# Altium schematic symbol library Analog Devices Data Converters Analog-to-Digital Converters.SchLib: 2404 symbols (part 14 of 213)
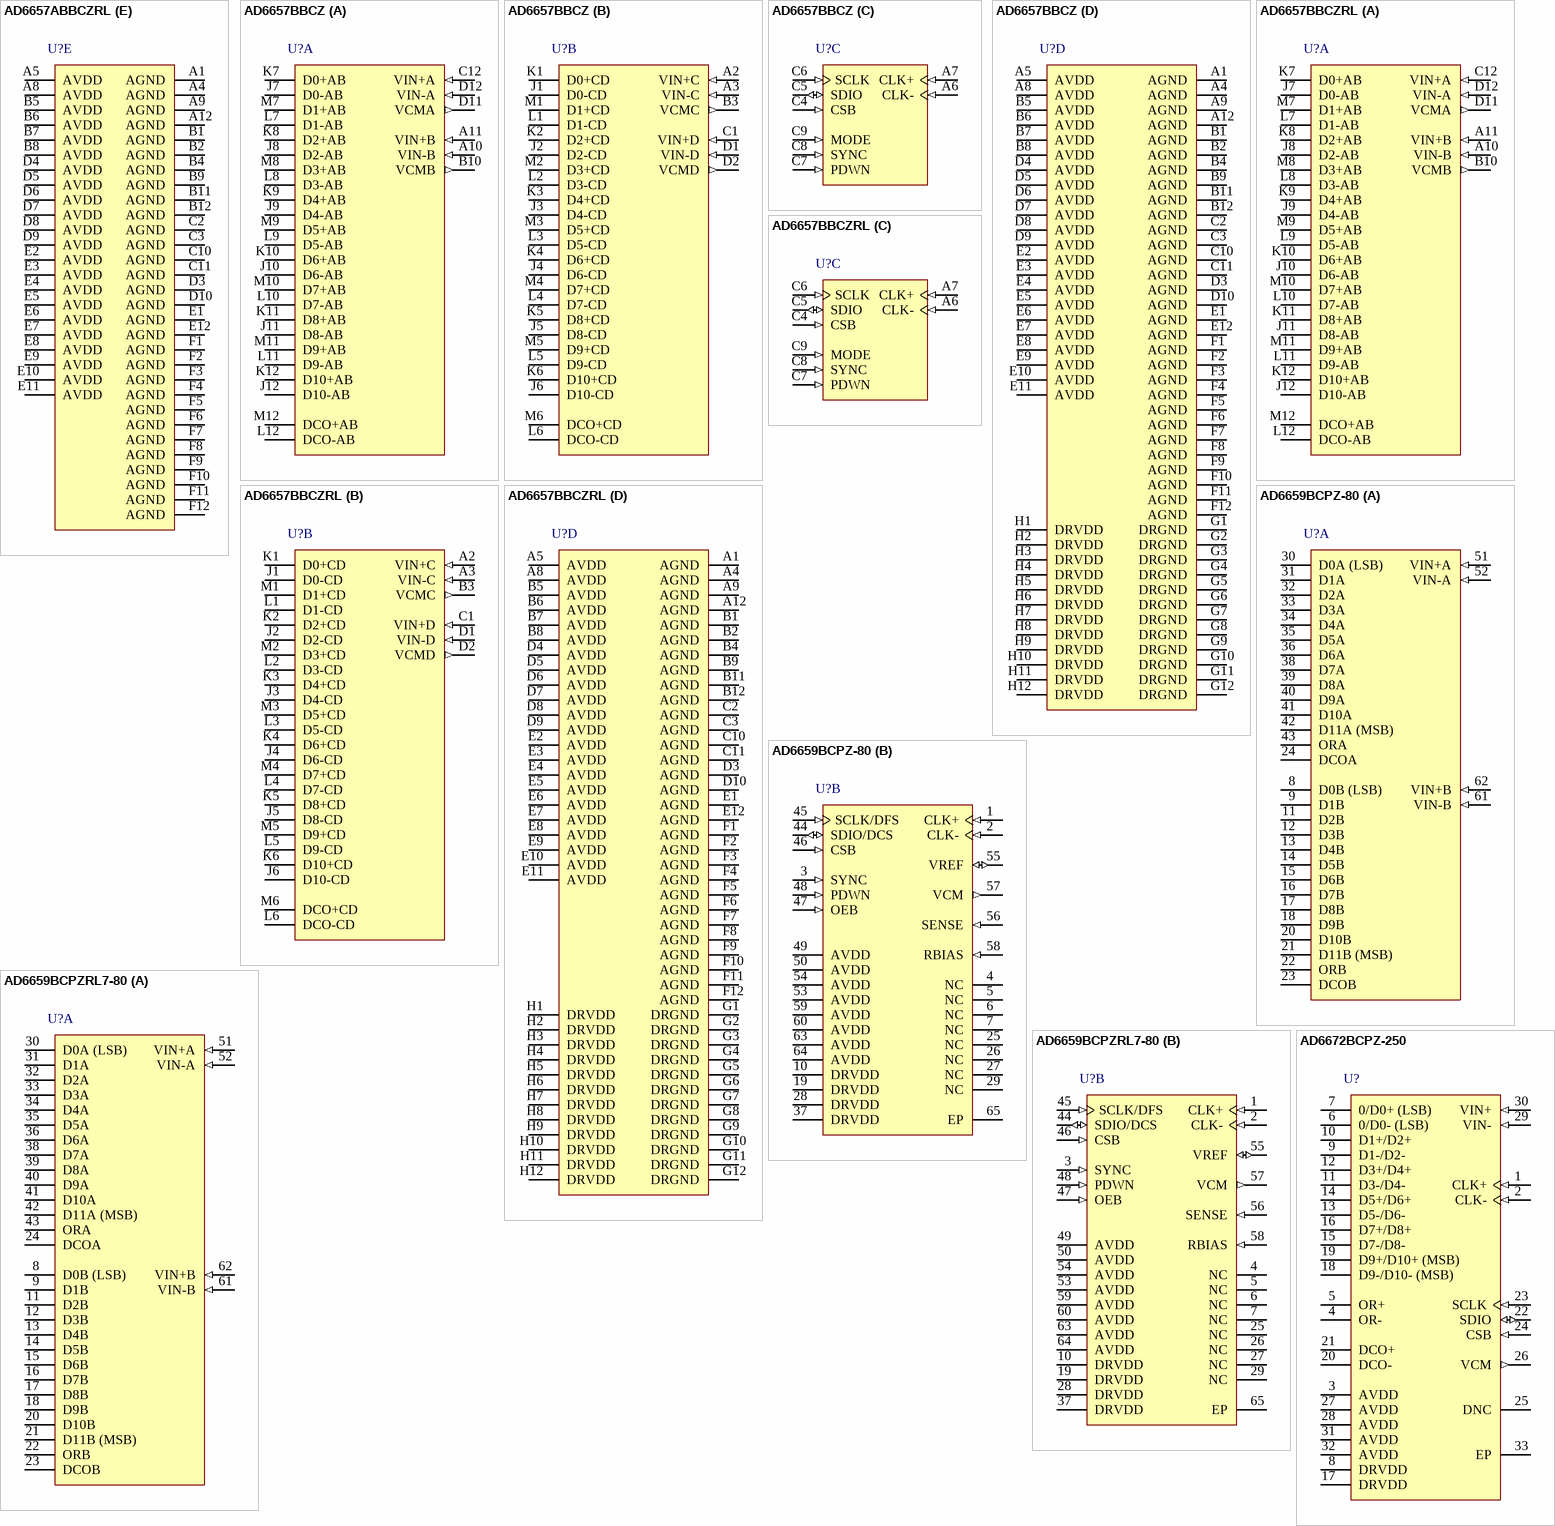
[diagram p169: symbols AD6657ABBCZRL to AD6672BCPZ-250]

## AD6657ABBCZRL
designator U?
Quad IF Receiver, -40 to +85 degC, BC-144-1, Pb-Free, Reel; Generic Part Number: AD6657A; Manufacturer: Analog Devices; PartNumber: AD6657ABBCZRL; Channels: 4; DatasheetVersion: Rev.0; PackageVersion: 012006-0; PackageReference: BC-144-1; PackageDescription: 144-Ball Chip Scale Package Ball Grid Array [CSP_BGA]; Supplier 1: Digi-Key; Supplier Part Number 1: AD6657ABBCZRL-ND; Supplier 2: Mouser; Supplier Part Number 2: 584-AD6657ABBCZR; RoHS: Y; Packing: Reel; Mounting Technology: Surface Mount; Code_JEDEC: MO-205-AC; ComponentLink1Description: Manufacturer URL; ComponentLink1URL: http://www.analog.com/en/index.html; ComponentLink2Description: Datasheet; ComponentLink2URL: http://www.analog.com/static/imported-files/data_sheets/AD6657A.pdf; ComponentLink3Description: Package Specification; ComponentLink3URL: http://www.analog.com/static/imported-files/packages/453163286836504146030385BC_144_1.pdf; ComponentLink4Description: Product URL; ComponentLink4URL: http://www.analog.com/en/analog-to-digital-converters/integrated-receivers/ad6657a/products/product.html
footprint BC-144-1 (BGA, 144-Leads, Body 10x10mm, Pitch 0.8mm)
part A pins: A10 VIN-B (in) "Differential Analog Input Pin (-) for Channel B.", A11 VIN+B (in) "Differential Analog Input Pin (+) for Channel B.", B10 VCMB (out) "Common-Mode Level Bias Output for Analog Input Channel B.", C12 VIN+A (in) "Differential Analog Input Pin (+) for Channel A.", D11 VCMA (out) "Common-Mode Level Bias Output for Analog Input Channel A.", D12 VIN-A (in) "Differential Analog Input Pin (-) for Channel A.", J7 D0-AB (out) "Channel A and Channel B LVDS Output Data 0--Complement.", J8 D2-AB (out) "Channel A and Channel B LVDS Output Data 2--Complement.", J9 D4-AB (out) "Channel A and Channel B LVDS Output Data 4--Complement.", J10 D6-AB (out) "Channel A and Channel B LVDS Output Data 6--Complement.", J11 D8-AB (out) "Channel A and Channel B LVDS Output Data 8--Complement.", J12 D10-AB (out) "Channel A and Channel B LVDS Output Data 10--Complement.", K7 D0+AB (out) "Channel A and Channel B LVDS Output Data 0--True.", K8 D2+AB (out) "Channel A and Channel B LVDS Output Data 2--True.", K9 D4+AB (out) "Channel A and Channel B LVDS Output Data 4--True.", K10 D6+AB (out) "Channel A and Channel B LVDS Output Data 6--True.", K11 D8+AB (out) "Channel A and Channel B LVDS Output Data 8--True.", K12 D10+AB (out) "Channel A and Channel B LVDS Output Data 10--True.", L7 D1-AB (out) "Channel A and Channel B LVDS Output Data 1--Complement.", L8 D3-AB (out) "Channel A and Channel B LVDS Output Data 3--Complement.", L9 D5-AB (out) "Channel A and Channel B LVDS Output Data 5--Complement.", L10 D7-AB (out) "Channel A and Channel B LVDS Output Data 7--Complement.", L11 D9-AB (out) "Channel A and Channel B LVDS Output Data 9--Complement.", L12 DCO-AB (out) "Data Clock LVDS Output for Channel A and Channel B--Complement.", M7 D1+AB (out) "Channel A and Channel B LVDS Output Data 1--True.", M8 D3+AB (out) "Channel A and Channel B LVDS Output Data 3--True.", M9 D5+AB (out) "Channel A and Channel B LVDS Output Data 5--True.", M10 D7+AB (out) "Channel A and Channel B LVDS Output Data 7--True.", M11 D9+AB (out) "Channel A and Channel B LVDS Output Data 9--True.", M12 DCO+AB (out) "Data Clock LVDS Output for Channel A and Channel B--True."
part B pins: A2 VIN+C (in) "Differential Analog Input Pin (+) for Channel C.", A3 VIN-C (in) "Differential Analog Input Pin (-) for Channel C.", B3 VCMC (out) "Common-Mode Level Bias Output for Analog Input Channel C.", C1 VIN+D (in) "Differential Analog Input Pin (+) for Channel D.", D1 VIN-D (in) "Differential Analog Input Pin (-) for Channel D.", D2 VCMD (out) "Common-Mode Level Bias Output for Analog Input Channel D.", J1 D0-CD (out) "Channel C and Channel D LVDS Output Data 0--Complement.", J2 D2-CD (out) "Channel C and Channel D LVDS Output Data 2--Complement.", J3 D4-CD (out) "Channel C and Channel D LVDS Output Data 4--Complement.", J4 D6-CD (out) "Channel C and Channel D LVDS Output Data 6--Complement.", J5 D8-CD (out) "Channel C and Channel D LVDS Output Data 8--Complement.", J6 D10-CD (out) "Channel C and Channel D LVDS Output Data 10--Complement.", K1 D0+CD (out) "Channel C and Channel D LVDS Output Data 0--True.", K2 D2+CD (out) "Channel C and Channel D LVDS Output Data 2--True.", K3 D4+CD (out) "Channel C and Channel D LVDS Output Data 4--True.", K4 D6+CD (out) "Channel C and Channel D LVDS Output Data 6--True.", K5 D8+CD (out) "Channel C and Channel D LVDS Output Data 8--True.", K6 D10+CD (out) "Channel C and Channel D LVDS Output Data 10--True.", L1 D1-CD (out) "Channel C and Channel D LVDS Output Data 1--Complement.", L2 D3-CD (out) "Channel C and Channel D LVDS Output Data 3--Complement.", L3 D5-CD (out) "Channel C and Channel D LVDS Output Data 5--Complement.", L4 D7-CD (out) "Channel C and Channel D LVDS Output Data 7--Complement.", L5 D9-CD (out) "Channel C and Channel D LVDS Output Data 9--Complement.", L6 DCO-CD (out) "Data Clock LVDS Output for Channel C and Channel D--Complement.", M1 D1+CD (out) "Channel C and Channel D LVDS Output Data 1--True.", M2 D3+CD (out) "Channel C and Channel D LVDS Output Data 3--True.", M3 D5+CD (out) "Channel C and Channel D LVDS Output Data 5--True.", M4 D7+CD (out) "Channel C and Channel D LVDS Output Data 7--True.", M5 D9+CD (out) "Channel C and Channel D LVDS Output Data 9--True.", M6 DCO+CD (out) "Data Clock LVDS Output for Channel C and Channel D--True."
part C pins: A6 CLK- (in) "ADC Clock Input--Complement.", A7 CLK+ (in) "ADC Clock Input--True.", C4 CSB (in) "SPI Chip Select (Active Low).", C5 SDIO (io) "SPI Data.", C6 SCLK (in) "SPI Clock.", C7 PDWN (in) "Power-Down Input (Active High).", C8 SYNC (in) "Digital Synchronization Pin.", C9 MODE (in) "Mode Select Pin. Logic low enables NSR; logic high disables NSR."
part D pins: G1 DRGND (power) "Digital Output Driver Ground.", G2 DRGND (power) "Digital Output Driver Ground.", G3 DRGND (power) "Digital Output Driver Ground.", G4 DRGND (power) "Digital Output Driver Ground.", G5 DRGND (power) "Digital Output Driver Ground.", G6 DRGND (power) "Digital Output Driver Ground.", G7 DRGND (power) "Digital Output Driver Ground.", G8 DRGND (power) "Digital Output Driver Ground.", G9 DRGND (power) "Digital Output Driver Ground.", G10 DRGND (power) "Digital Output Driver Ground.", G11 DRGND (power) "Digital Output Driver Ground.", G12 DRGND (power) "Digital Output Driver Ground.", H1 DRVDD (power) "Digital Output Driver Supply. 1.8 V nominal.", H2 DRVDD (power) "Digital Output Driver Supply. 1.8 V nominal.", H3 DRVDD (power) "Digital Output Driver Supply. 1.8 V nominal.", H4 DRVDD (power) "Digital Output Driver Supply. 1.8 V nominal.", H5 DRVDD (power) "Digital Output Driver Supply. 1.8 V nominal.", H6 DRVDD (power) "Digital Output Driver Supply. 1.8 V nominal.", H7 DRVDD (power) "Digital Output Driver Supply. 1.8 V nominal.", H8 DRVDD (power) "Digital Output Driver Supply. 1.8 V nominal.", H9 DRVDD (power) "Digital Output Driver Supply. 1.8 V nominal.", H10 DRVDD (power) "Digital Output Driver Supply. 1.8 V nominal.", H11 DRVDD (power) "Digital Output Driver Supply. 1.8 V nominal.", H12 DRVDD (power) "Digital Output Driver Supply. 1.8 V nominal."
part E pins: A1 AGND (power) "Analog Ground.", A4 AGND (power) "Analog Ground.", A5 AVDD (power) "Analog Power Supply. 1.8 V nominal.", A8 AVDD (power) "Analog Power Supply. 1.8 V nominal.", A9 AGND (power) "Analog Ground.", A12 AGND (power) "Analog Ground.", B1 AGND (power) "Analog Ground.", B2 AGND (power) "Analog Ground.", B4 AGND (power) "Analog Ground.", B5 AVDD (power) "Analog Power Supply. 1.8 V nominal.", B6 AVDD (power) "Analog Power Supply. 1.8 V nominal.", B7 AVDD (power) "Analog Power Supply. 1.8 V nominal.", B8 AVDD (power) "Analog Power Supply. 1.8 V nominal.", B9 AGND (power) "Analog Ground.", B11 AGND (power) "Analog Ground.", B12 AGND (power) "Analog Ground.", C2 AGND (power) "Analog Ground.", C3 AGND (power) "Analog Ground.", C10 AGND (power) "Analog Ground.", C11 AGND (power) "Analog Ground.", D3 AGND (power) "Analog Ground.", D4 AVDD (power) "Analog Power Supply. 1.8 V nominal.", D5 AVDD (power) "Analog Power Supply. 1.8 V nominal.", D6 AVDD (power) "Analog Power Supply. 1.8 V nominal.", D7 AVDD (power) "Analog Power Supply. 1.8 V nominal.", D8 AVDD (power) "Analog Power Supply. 1.8 V nominal.", D9 AVDD (power) "Analog Power Supply. 1.8 V nominal.", D10 AGND (power) "Analog Ground.", E1 AGND (power) "Analog Ground.", E2 AVDD (power) "Analog Power Supply. 1.8 V nominal.", E3 AVDD (power) "Analog Power Supply. 1.8 V nominal.", E4 AVDD (power) "Analog Power Supply. 1.8 V nominal.", E5 AVDD (power) "Analog Power Supply. 1.8 V nominal.", E6 AVDD (power) "Analog Power Supply. 1.8 V nominal.", E7 AVDD (power) "Analog Power Supply. 1.8 V nominal.", E8 AVDD (power) "Analog Power Supply. 1.8 V nominal.", E9 AVDD (power) "Analog Power Supply. 1.8 V nominal.", E10 AVDD (power) "Analog Power Supply. 1.8 V nominal.", E11 AVDD (power) "Analog Power Supply. 1.8 V nominal.", E12 AGND (power) "Analog Ground.", F1 AGND (power) "Analog Ground.", F2 AGND (power) "Analog Ground.", F3 AGND (power) "Analog Ground.", F4 AGND (power) "Analog Ground.", F5 AGND (power) "Analog Ground.", F6 AGND (power) "Analog Ground.", F7 AGND (power) "Analog Ground.", F8 AGND (power) "Analog Ground.", F9 AGND (power) "Analog Ground.", F10 AGND (power) "Analog Ground.", F11 AGND (power) "Analog Ground.", F12 AGND (power) "Analog Ground."

## AD6657BBCZ
designator U?
Quad 11-Bit IF Receiver with LVDS, Parallel Interface, 200MSPS, -40 to +85 degC, BC-144-1, Pb-Free, Tray; Generic Part Number: AD6657; Manufacturer: Analog Devices; PartNumber: AD6657BBCZ; Resolution (Bits): 11; Channels: 4; Throughput Rate (SPS): 200M; DatasheetVersion: Rev.B; PackageVersion: 012006-0; PackageReference: BC-144-1; PackageDescription: 144-Ball Chip Scale Package Ball Grid Array [CSP_BGA]; Supplier 1: Digi-Key; Supplier Part Number 1: AD6657BBCZ-ND; Supplier 2: Farnell; Supplier Part Number 2: 2081220; Supplier 3: Mouser; Supplier Part Number 3: 584-AD6657BBCZ; Interface: LVDS, Par; RoHS: Y; Packing: Tray; Mounting Technology: Surface Mount; Code_JEDEC: MO-205-AC; ComponentLink1Description: Manufacturer URL; ComponentLink1URL: http://www.analog.com/en/index.html; ComponentLink2Description: Datasheet; ComponentLink2URL: http://www.analog.com/static/imported-files/data_sheets/AD6657.pdf; ComponentLink3Description: Package Specification; ComponentLink3URL: http://www.analog.com/static/imported-files/packages/453163286836504146030385BC_144_1.pdf; ComponentLink4Description: Product URL; ComponentLink4URL: http://www.analog.com/en/analog-to-digital-converters/integrated-receivers/ad6657/products/product.html
footprint BC-144-1 (BGA, 144-Leads, Body 10x10mm, Pitch 0.8mm)
part A pins: A10 VIN-B (in) "Differential Analog Input Pin (-) for Channel B", A11 VIN+B (in) "Differential Analog Input Pin (+) for Channel B", B10 VCMB (out) "Common-Mode Level Bias Output for Analog Input Channel B", C12 VIN+A (in) "Differential Analog Input Pin (+) for Channel A", D11 VCMA (out) "Common-Mode Level Bias Output for Analog Input Channel A", D12 VIN-A (in) "Differential Analog Input Pin (-) for Channel A", J7 D0-AB (hiz) "Channel A and Channel B LVDS Output Data 0--Complement", J8 D2-AB (hiz) "Channel A and Channel B LVDS Output Data 2--Complement", J9 D4-AB (hiz) "Channel A and Channel B LVDS Output Data 4--Complement", J10 D6-AB (hiz) "Channel A and Channel B LVDS Output Data 6--Complement", J11 D8-AB (hiz) "Channel A and Channel B LVDS Output Data 8--Complement", J12 D10-AB (hiz) "Channel A and Channel B LVDS Output Data 10--Complement", K7 D0+AB (hiz) "Channel A and Channel B LVDS Output Data 0--True", K8 D2+AB (hiz) "Channel A and Channel B LVDS Output Data 2--True", K9 D4+AB (hiz) "Channel A and Channel B LVDS Output Data 4--True", K10 D6+AB (hiz) "Channel A and Channel B LVDS Output Data 6--True", K11 D8+AB (hiz) "Channel A and Channel B LVDS Output Data 6--True", K12 D10+AB (hiz) "Channel A and Channel B LVDS Output Data 6--True", L7 D1-AB (hiz) "Channel A and Channel B LVDS Output Data 1--Complement", L8 D3-AB (hiz) "Channel A and Channel B LVDS Output Data 3--Complement", L9 D5-AB (hiz) "Channel A and Channel B LVDS Output Data 5--Complement", L10 D7-AB (hiz) "Channel A and Channel B LVDS Output Data 7--Complement", L11 D9-AB (hiz) "Channel A and Channel B LVDS Output Data 9--Complement", L12 DCO-AB (hiz) "Data Clock LVDS Output for Channel A and Channel B--Complement", M7 D1+AB (hiz) "Channel A and Channel B LVDS Output Data 1--True", M8 D3+AB (hiz) "Channel A and Channel B LVDS Output Data 3--True", M9 D5+AB (hiz) "Channel A and Channel B LVDS Output Data 5--True", M10 D7+AB (hiz) "Channel A and Channel B LVDS Output Data 7--True", M11 D9+AB (hiz) "Channel A and Channel B LVDS Output Data 9--True", M12 DCO+AB (hiz) "Data Clock LVDS Output for Channel A and Channel B--True"
part B pins: A2 VIN+C (in) "Differential Analog Input Pin (+) for Channel C", A3 VIN-C (in) "Differential Analog Input Pin (-) for Channel C", B3 VCMC (out) "Common-Mode Level Bias Output for Analog Input Channel C", C1 VIN+D (in) "Differential Analog Input Pin (+) for Channel D", D1 VIN-D (in) "Differential Analog Input Pin (-) for Channel D", D2 VCMD (out) "Common-Mode Level Bias Output for Analog Input Channel D", J1 D0-CD (hiz) "Channel C and Channel D LVDS Output Data 0--Complement", J2 D2-CD (hiz) "Channel C and Channel D LVDS Output Data 2--Complement", J3 D4-CD (hiz) "Channel C and Channel D LVDS Output Data 4--Complement", J4 D6-CD (hiz) "Channel C and Channel D LVDS Output Data 6--Complement", J5 D8-CD (hiz) "Channel C and Channel D LVDS Output Data 8--Complement", J6 D10-CD (hiz) "Channel C and Channel D LVDS Output Data 10--Complement", K1 D0+CD (hiz) "Channel C and Channel D LVDS Output Data 0--True", K2 D2+CD (hiz) "Channel C and Channel D LVDS Output Data 2--True", K3 D4+CD (hiz) "Channel C and Channel D LVDS Output Data 4--True", K4 D6+CD (hiz) "Channel C and Channel D LVDS Output Data 6--True", K5 D8+CD (hiz) "Channel C and Channel D LVDS Output Data 8--True", K6 D10+CD (hiz) "Channel C and Channel D LVDS Output Data 10--True", L1 D1-CD (hiz) "Channel C and Channel D LVDS Output Data 1--Complement", L2 D3-CD (hiz) "Channel C and Channel D LVDS Output Data 3--Complement", L3 D5-CD (hiz) "Channel C and Channel D LVDS Output Data 5--Complement", L4 D7-CD (hiz) "Channel C and Channel D LVDS Output Data 7--Complement", L5 D9-CD (hiz) "Channel C and Channel D LVDS Output Data 9--Complement", L6 DCO-CD (hiz) "Data Clock LVDS Output for Channel C and Channel D--Complement", M1 D1+CD (hiz) "Channel C and Channel D LVDS Output Data 1--True", M2 D3+CD (hiz) "Channel C and Channel D LVDS Output Data 3--True", M3 D5+CD (hiz) "Channel C and Channel D LVDS Output Data 5--True", M4 D7+CD (hiz) "Channel C and Channel D LVDS Output Data 7--True", M5 D9+CD (hiz) "Channel C and Channel D LVDS Output Data 9--True", M6 DCO+CD (hiz) "Data Clock LVDS Output for Channel C and Channel D--True"
part C pins: A6 CLK- (in) "ADC Clock Input--Complement", A7 CLK+ (in) "ADC Clock Input--True", C4 CSB (in) "SPI Chip Select (Active Low)", C5 SDIO (io) "SPI Data", C6 SCLK (in) "SPI Clock", C7 PDWN (in) "Power-Down Input (Active High)", C8 SYNC (in) "Digital Synchronization Pin", C9 MODE (in) "Mode Select Pin (Logic Low Enables NSR; Logic High Disables NSR)"
part D pins: A1 AGND (power) "Analog Ground", A4 AGND (power) "Analog Ground", A5 AVDD (power) "Analog Power Supply (1.8 V Nominal)", A8 AVDD (power) "Analog Power Supply (1.8 V Nominal)", A9 AGND (power) "Analog Ground", A12 AGND (power) "Analog Ground", B1 AGND (power) "Analog Ground", B2 AGND (power) "Analog Ground", B4 AGND (power) "Analog Ground", B5 AVDD (power) "Analog Power Supply (1.8 V Nominal)", B6 AVDD (power) "Analog Power Supply (1.8 V Nominal)", B7 AVDD (power) "Analog Power Supply (1.8 V Nominal)", B8 AVDD (power) "Analog Power Supply (1.8 V Nominal)", B9 AGND (power) "Analog Ground", B11 AGND (power) "Analog Ground", B12 AGND (power) "Analog Ground", C2 AGND (power) "Analog Ground", C3 AGND (power) "Analog Ground", C10 AGND (power) "Analog Ground", C11 AGND (power) "Analog Ground", D3 AGND (power) "Analog Ground", D4 AVDD (power) "Analog Power Supply (1.8 V Nominal)", D5 AVDD (power) "Analog Power Supply (1.8 V Nominal)", D6 AVDD (power) "Analog Power Supply (1.8 V Nominal)", D7 AVDD (power) "Analog Power Supply (1.8 V Nominal)", D8 AVDD (power) "Analog Power Supply (1.8 V Nominal)", D9 AVDD (power) "Analog Power Supply (1.8 V Nominal)", D10 AGND (power) "Analog Ground", E1 AGND (power) "Analog Ground", E2 AVDD (power) "Analog Power Supply (1.8 V Nominal)", E3 AVDD (power) "Analog Power Supply (1.8 V Nominal)", E4 AVDD (power) "Analog Power Supply (1.8 V Nominal)", E5 AVDD (power) "Analog Power Supply (1.8 V Nominal)", E6 AVDD (power) "Analog Power Supply (1.8 V Nominal)", E7 AVDD (power) "Analog Power Supply (1.8 V Nominal)", E8 AVDD (power) "Analog Power Supply (1.8 V Nominal)", E9 AVDD (power) "Analog Power Supply (1.8 V Nominal)", E10 AVDD (power) "Analog Power Supply (1.8 V Nominal)", E11 AVDD (power) "Analog Power Supply (1.8 V Nominal)", E12 AGND (power) "Analog Ground", F1 AGND (power) "Analog Ground", F2 AGND (power) "Analog Ground", F3 AGND (power) "Analog Ground", F4 AGND (power) "Analog Ground", F5 AGND (power) "Analog Ground", F6 AGND (power) "Analog Ground", F7 AGND (power) "Analog Ground", F8 AGND (power) "Analog Ground", F9 AGND (power) "Analog Ground", F10 AGND (power) "Analog Ground", F11 AGND (power) "Analog Ground", F12 AGND (power) "Analog Ground", G1 DRGND (power) "Digital Output Driver Ground", G2 DRGND (power) "Digital Output Driver Ground", G3 DRGND (power) "Digital Output Driver Ground", G4 DRGND (power) "Digital Output Driver Ground", G5 DRGND (power) "Digital Output Driver Ground", G6 DRGND (power) "Digital Output Driver Ground", G7 DRGND (power) "Digital Output Driver Ground", G8 DRGND (power) "Digital Output Driver Ground", G9 DRGND (power) "Digital Output Driver Ground", G10 DRGND (power) "Digital Output Driver Ground", G11 DRGND (power) "Digital Output Driver Ground", G12 DRGND (power) "Digital Output Driver Ground", H1 DRVDD (power) "Digital Output Driver Supply (1.8 V Nominal)", H2 DRVDD (power) "Digital Output Driver Supply (1.8 V Nominal)", H3 DRVDD (power) "Digital Output Driver Supply (1.8 V Nominal)", H4 DRVDD (power) "Digital Output Driver Supply (1.8 V Nominal)", H5 DRVDD (power) "Digital Output Driver Supply (1.8 V Nominal)", H6 DRVDD (power) "Digital Output Driver Supply (1.8 V Nominal)", H7 DRVDD (power) "Digital Output Driver Supply (1.8 V Nominal)", H8 DRVDD (power) "Digital Output Driver Supply (1.8 V Nominal)", H9 DRVDD (power) "Digital Output Driver Supply (1.8 V Nominal)", H10 DRVDD (power) "Digital Output Driver Supply (1.8 V Nominal)", H11 DRVDD (power) "Digital Output Driver Supply (1.8 V Nominal)", H12 DRVDD (power) "Digital Output Driver Supply (1.8 V Nominal)"

## AD6657BBCZRL
designator U?
Quad 11-Bit IF Receiver with LVDS, Parallel Interface, 200MSPS, -40 to +85 degC, BC-144-1, Pb-Free, Reel; Generic Part Number: AD6657; Manufacturer: Analog Devices; PartNumber: AD6657BBCZRL; Resolution (Bits): 11; Channels: 4; Throughput Rate (SPS): 200M; DatasheetVersion: Rev.B; PackageVersion: 012006-0; PackageReference: BC-144-1; PackageDescription: 144-Ball Chip Scale Package Ball Grid Array [CSP_BGA]; Supplier 1: Digi-Key; Supplier Part Number 1: AD6657BBCZRL-ND; Supplier 2: Mouser; Supplier Part Number 2: 584-AD6657BBCZR; Interface: LVDS, Par; RoHS: Y; Packing: Reel; Mounting Technology: Surface Mount; Code_JEDEC: MO-205-AC; ComponentLink1Description: Manufacturer URL; ComponentLink1URL: http://www.analog.com/en/index.html; ComponentLink2Description: Datasheet; ComponentLink2URL: http://www.analog.com/static/imported-files/data_sheets/AD6657.pdf; ComponentLink3Description: Package Specification; ComponentLink3URL: http://www.analog.com/static/imported-files/packages/453163286836504146030385BC_144_1.pdf; ComponentLink4Description: Product URL; ComponentLink4URL: http://www.analog.com/en/analog-to-digital-converters/integrated-receivers/ad6657/products/product.html
footprint BC-144-1 (BGA, 144-Leads, Body 10x10mm, Pitch 0.8mm)
part A pins: A10 VIN-B (in) "Differential Analog Input Pin (-) for Channel B", A11 VIN+B (in) "Differential Analog Input Pin (+) for Channel B", B10 VCMB (out) "Common-Mode Level Bias Output for Analog Input Channel B", C12 VIN+A (in) "Differential Analog Input Pin (+) for Channel A", D11 VCMA (out) "Common-Mode Level Bias Output for Analog Input Channel A", D12 VIN-A (in) "Differential Analog Input Pin (-) for Channel A", J7 D0-AB (hiz) "Channel A and Channel B LVDS Output Data 0--Complement", J8 D2-AB (hiz) "Channel A and Channel B LVDS Output Data 2--Complement", J9 D4-AB (hiz) "Channel A and Channel B LVDS Output Data 4--Complement", J10 D6-AB (hiz) "Channel A and Channel B LVDS Output Data 6--Complement", J11 D8-AB (hiz) "Channel A and Channel B LVDS Output Data 8--Complement", J12 D10-AB (hiz) "Channel A and Channel B LVDS Output Data 10--Complement", K7 D0+AB (hiz) "Channel A and Channel B LVDS Output Data 0--True", K8 D2+AB (hiz) "Channel A and Channel B LVDS Output Data 2--True", K9 D4+AB (hiz) "Channel A and Channel B LVDS Output Data 4--True", K10 D6+AB (hiz) "Channel A and Channel B LVDS Output Data 6--True", K11 D8+AB (hiz) "Channel A and Channel B LVDS Output Data 6--True", K12 D10+AB (hiz) "Channel A and Channel B LVDS Output Data 6--True", L7 D1-AB (hiz) "Channel A and Channel B LVDS Output Data 1--Complement", L8 D3-AB (hiz) "Channel A and Channel B LVDS Output Data 3--Complement", L9 D5-AB (hiz) "Channel A and Channel B LVDS Output Data 5--Complement", L10 D7-AB (hiz) "Channel A and Channel B LVDS Output Data 7--Complement", L11 D9-AB (hiz) "Channel A and Channel B LVDS Output Data 9--Complement", L12 DCO-AB (hiz) "Data Clock LVDS Output for Channel A and Channel B--Complement", M7 D1+AB (hiz) "Channel A and Channel B LVDS Output Data 1--True", M8 D3+AB (hiz) "Channel A and Channel B LVDS Output Data 3--True", M9 D5+AB (hiz) "Channel A and Channel B LVDS Output Data 5--True", M10 D7+AB (hiz) "Channel A and Channel B LVDS Output Data 7--True", M11 D9+AB (hiz) "Channel A and Channel B LVDS Output Data 9--True", M12 DCO+AB (hiz) "Data Clock LVDS Output for Channel A and Channel B--True"
part B pins: A2 VIN+C (in) "Differential Analog Input Pin (+) for Channel C", A3 VIN-C (in) "Differential Analog Input Pin (-) for Channel C", B3 VCMC (out) "Common-Mode Level Bias Output for Analog Input Channel C", C1 VIN+D (in) "Differential Analog Input Pin (+) for Channel D", D1 VIN-D (in) "Differential Analog Input Pin (-) for Channel D", D2 VCMD (out) "Common-Mode Level Bias Output for Analog Input Channel D", J1 D0-CD (hiz) "Channel C and Channel D LVDS Output Data 0--Complement", J2 D2-CD (hiz) "Channel C and Channel D LVDS Output Data 2--Complement", J3 D4-CD (hiz) "Channel C and Channel D LVDS Output Data 4--Complement", J4 D6-CD (hiz) "Channel C and Channel D LVDS Output Data 6--Complement", J5 D8-CD (hiz) "Channel C and Channel D LVDS Output Data 8--Complement", J6 D10-CD (hiz) "Channel C and Channel D LVDS Output Data 10--Complement", K1 D0+CD (hiz) "Channel C and Channel D LVDS Output Data 0--True", K2 D2+CD (hiz) "Channel C and Channel D LVDS Output Data 2--True", K3 D4+CD (hiz) "Channel C and Channel D LVDS Output Data 4--True", K4 D6+CD (hiz) "Channel C and Channel D LVDS Output Data 6--True", K5 D8+CD (hiz) "Channel C and Channel D LVDS Output Data 8--True", K6 D10+CD (hiz) "Channel C and Channel D LVDS Output Data 10--True", L1 D1-CD (hiz) "Channel C and Channel D LVDS Output Data 1--Complement", L2 D3-CD (hiz) "Channel C and Channel D LVDS Output Data 3--Complement", L3 D5-CD (hiz) "Channel C and Channel D LVDS Output Data 5--Complement", L4 D7-CD (hiz) "Channel C and Channel D LVDS Output Data 7--Complement", L5 D9-CD (hiz) "Channel C and Channel D LVDS Output Data 9--Complement", L6 DCO-CD (hiz) "Data Clock LVDS Output for Channel C and Channel D--Complement", M1 D1+CD (hiz) "Channel C and Channel D LVDS Output Data 1--True", M2 D3+CD (hiz) "Channel C and Channel D LVDS Output Data 3--True", M3 D5+CD (hiz) "Channel C and Channel D LVDS Output Data 5--True", M4 D7+CD (hiz) "Channel C and Channel D LVDS Output Data 7--True", M5 D9+CD (hiz) "Channel C and Channel D LVDS Output Data 9--True", M6 DCO+CD (hiz) "Data Clock LVDS Output for Channel C and Channel D--True"
part C pins: A6 CLK- (in) "ADC Clock Input--Complement", A7 CLK+ (in) "ADC Clock Input--True", C4 CSB (in) "SPI Chip Select (Active Low)", C5 SDIO (io) "SPI Data", C6 SCLK (in) "SPI Clock", C7 PDWN (in) "Power-Down Input (Active High)", C8 SYNC (in) "Digital Synchronization Pin", C9 MODE (in) "Mode Select Pin (Logic Low Enables NSR; Logic High Disables NSR)"
part D pins: A1 AGND (power) "Analog Ground", A4 AGND (power) "Analog Ground", A5 AVDD (power) "Analog Power Supply (1.8 V Nominal)", A8 AVDD (power) "Analog Power Supply (1.8 V Nominal)", A9 AGND (power) "Analog Ground", A12 AGND (power) "Analog Ground", B1 AGND (power) "Analog Ground", B2 AGND (power) "Analog Ground", B4 AGND (power) "Analog Ground", B5 AVDD (power) "Analog Power Supply (1.8 V Nominal)", B6 AVDD (power) "Analog Power Supply (1.8 V Nominal)", B7 AVDD (power) "Analog Power Supply (1.8 V Nominal)", B8 AVDD (power) "Analog Power Supply (1.8 V Nominal)", B9 AGND (power) "Analog Ground", B11 AGND (power) "Analog Ground", B12 AGND (power) "Analog Ground", C2 AGND (power) "Analog Ground", C3 AGND (power) "Analog Ground", C10 AGND (power) "Analog Ground", C11 AGND (power) "Analog Ground", D3 AGND (power) "Analog Ground", D4 AVDD (power) "Analog Power Supply (1.8 V Nominal)", D5 AVDD (power) "Analog Power Supply (1.8 V Nominal)", D6 AVDD (power) "Analog Power Supply (1.8 V Nominal)", D7 AVDD (power) "Analog Power Supply (1.8 V Nominal)", D8 AVDD (power) "Analog Power Supply (1.8 V Nominal)", D9 AVDD (power) "Analog Power Supply (1.8 V Nominal)", D10 AGND (power) "Analog Ground", E1 AGND (power) "Analog Ground", E2 AVDD (power) "Analog Power Supply (1.8 V Nominal)", E3 AVDD (power) "Analog Power Supply (1.8 V Nominal)", E4 AVDD (power) "Analog Power Supply (1.8 V Nominal)", E5 AVDD (power) "Analog Power Supply (1.8 V Nominal)", E6 AVDD (power) "Analog Power Supply (1.8 V Nominal)", E7 AVDD (power) "Analog Power Supply (1.8 V Nominal)", E8 AVDD (power) "Analog Power Supply (1.8 V Nominal)", E9 AVDD (power) "Analog Power Supply (1.8 V Nominal)", E10 AVDD (power) "Analog Power Supply (1.8 V Nominal)", E11 AVDD (power) "Analog Power Supply (1.8 V Nominal)", E12 AGND (power) "Analog Ground", F1 AGND (power) "Analog Ground", F2 AGND (power) "Analog Ground", F3 AGND (power) "Analog Ground", F4 AGND (power) "Analog Ground", F5 AGND (power) "Analog Ground", F6 AGND (power) "Analog Ground", F7 AGND (power) "Analog Ground", F8 AGND (power) "Analog Ground", F9 AGND (power) "Analog Ground", F10 AGND (power) "Analog Ground", F11 AGND (power) "Analog Ground", F12 AGND (power) "Analog Ground", G1 DRGND (power) "Digital Output Driver Ground", G2 DRGND (power) "Digital Output Driver Ground", G3 DRGND (power) "Digital Output Driver Ground", G4 DRGND (power) "Digital Output Driver Ground", G5 DRGND (power) "Digital Output Driver Ground", G6 DRGND (power) "Digital Output Driver Ground", G7 DRGND (power) "Digital Output Driver Ground", G8 DRGND (power) "Digital Output Driver Ground", G9 DRGND (power) "Digital Output Driver Ground", G10 DRGND (power) "Digital Output Driver Ground", G11 DRGND (power) "Digital Output Driver Ground", G12 DRGND (power) "Digital Output Driver Ground", H1 DRVDD (power) "Digital Output Driver Supply (1.8 V Nominal)", H2 DRVDD (power) "Digital Output Driver Supply (1.8 V Nominal)", H3 DRVDD (power) "Digital Output Driver Supply (1.8 V Nominal)", H4 DRVDD (power) "Digital Output Driver Supply (1.8 V Nominal)", H5 DRVDD (power) "Digital Output Driver Supply (1.8 V Nominal)", H6 DRVDD (power) "Digital Output Driver Supply (1.8 V Nominal)", H7 DRVDD (power) "Digital Output Driver Supply (1.8 V Nominal)", H8 DRVDD (power) "Digital Output Driver Supply (1.8 V Nominal)", H9 DRVDD (power) "Digital Output Driver Supply (1.8 V Nominal)", H10 DRVDD (power) "Digital Output Driver Supply (1.8 V Nominal)", H11 DRVDD (power) "Digital Output Driver Supply (1.8 V Nominal)", H12 DRVDD (power) "Digital Output Driver Supply (1.8 V Nominal)"